# Altium footprint library Nanjar's Library.PcbLib: 153 footprints (part 2 of 10)
Each footprint in its own frame and in the unit in brackets; x right, y up, seen from the top. Pads: shape width x height; smd on the part's side, far side on the other; paste and mask are expansions set on the pad; w line width, h text height; cw(c..) or ccw(c..) is an arc to the next point about the centre after c.
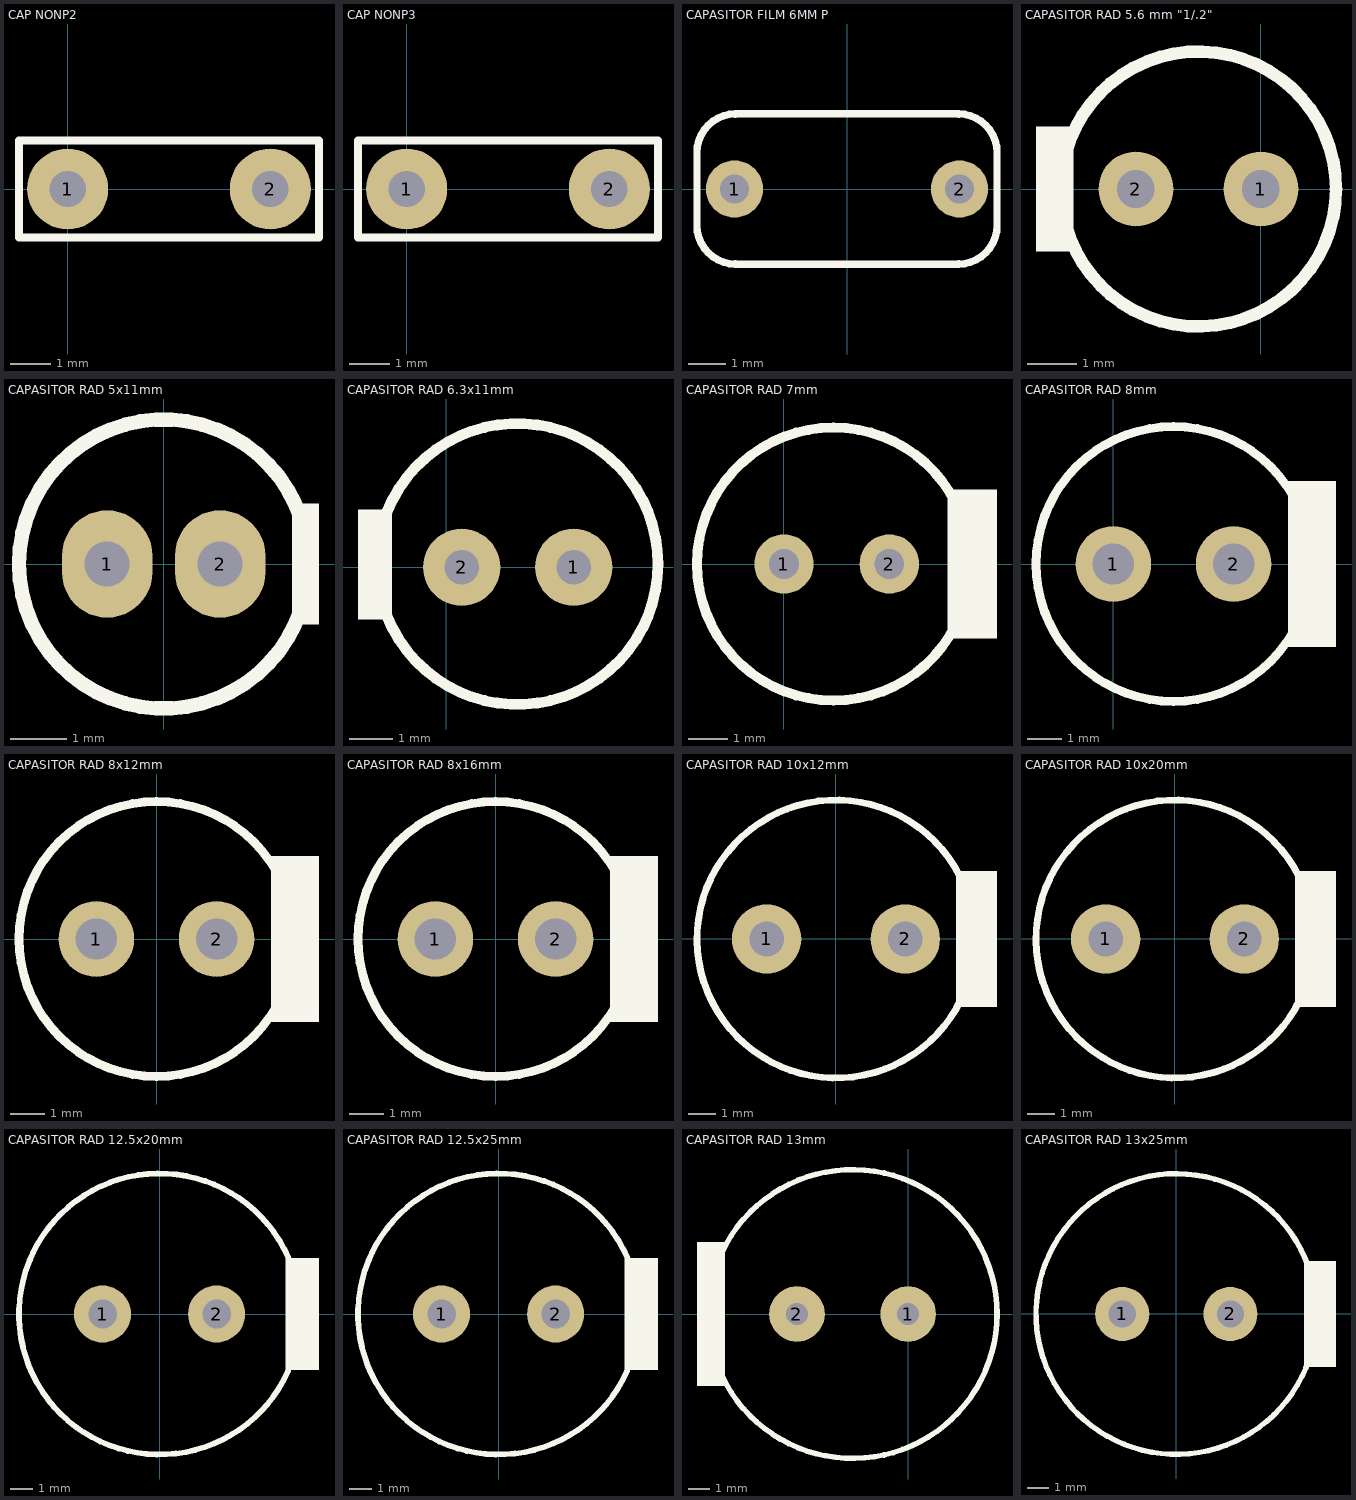
[diagram p1: the footprints below, top view; thin cyan lines are the x and y axes]

## CAP NONP2 [mm]
pads (2):
  round 2 hole 0.9: 1(0,0) 2(5,0)
Top Overlay:
  lines w0.2: -1.2,-1.2 6.2,-1.2 6.2,1.2 -1.2,1.2 -1.2,-1.2
3D body "User Library-Cap-5 (7_2x6_5x2_2)Dark.step": height 7.13, standoff -3.4, extent -1.1,-1.1 6.1,1.1

## CAP NONP3 [mm]
pads (2):
  round 2 hole 0.9: 1(0,0) 2(5,0)
Top Overlay:
  lines w0.2: -1.2,-1.2 6.2,-1.2 6.2,1.2 -1.2,1.2 -1.2,-1.2
3D body "User Library-Cap-5 (7_2x7_5x2_2).step": height 8.13, standoff -3.4, extent -1.1,-1.1 6.1,1.1

## CAPASITOR FILM 6MM P [mil]
pads (2):
  round 60 hole 30: 1(-118.11,0) 2(118.11,0)
Top Overlay:
  lines w7.87: -157.48,-38.41 ccw(c-117.16,-38.41) -117.16,-78.74 117.16,-78.74 ccw(c117.16,-38.42) 157.48,-38.42 157.48,38.41 ccw(c117.16,38.41) 117.16,78.74 -117.16,78.74 ccw(c-117.16,38.42) -157.48,38.42 -157.48,-38.41
3D body "User Library-Film Capacitor 6x8mm.step": height 472.48, standoff -196.56, extent -157.48,-78.74 157.48,78.74

## CAPASITOR RAD 5.6 mm "1/.2" [mil]
height 55.12
pads (2):
  round 60 hole 30: 1(0,0) 2(-100,0)
Top Overlay:
  circle w10: c-50,0 r110
  rectangle: -180,-50 -150,50
3D body "User Library-CE_R100_D200_H460.step": height 66.93, standoff -527.56, extent -148.74,-99.19 51.19,100.77

## CAPASITOR RAD 5x11mm [mm]
pads (2):
  oval 1.6x1.9 hole 0.8: 1(-1,0) 2(1,0)
Top Overlay:
  circle w0.254: c0,0 r2.56
  rectangle: 2.27,-1.068 2.75,1.075
3D body "User Library-Cap-EL(5x11-2)T.step": height 11.4, standoff -2.4, extent -2.485,-2.489 2.517,2.511

## CAPASITOR RAD 6.3x11mm [mm]
pads (2):
  round 1.8 hole 0.8: 1(2.967,0) 2(0.356,0)
Top Overlay:
  circle w0.25: c1.655,0.076 r3.273
  rectangle: -2.06,-1.219 -1.27,1.346
3D body "User Library-Cap-EL(6_3x11-2_5).step": height 11.5, standoff -2.7, extent -1.524,-3.175 4.778,3.112

## CAPASITOR RAD 7mm [mil]
pads (2):
  round 60 hole 30: 1(0,0) 2(106.3,0)
Top Overlay:
  circle w10: c50,0 r137.8
  rectangle: 165,-75 215,75

## CAPASITOR RAD 8mm [mm]
pads (2):
  round 2.2 hole 1.2: 1(0,0) 2(3.5,0)
Top Overlay:
  circle w0.254: c1.75,0 r4
  rectangle: 5.08,-2.413 6.477,2.413
3D body: height 11.51, standoff 5, extent -0.97,-2.72 4.47,2.72
3D body: height 11.5, standoff 0.1, extent -2.249,-3.999 5.749,3.999

## CAPASITOR RAD 8x12mm [mm]
pads (2):
  round 2.2 hole 1.2: 1(-1.75,0) 2(1.75,0)
Top Overlay:
  circle w0.254: c0,0 r4
  rectangle: 3.33,-2.413 4.727,2.413
3D body "User Library-Cap-EL(8x12-3_5)T.step": height 12.3, standoff -3.3, extent -4,-3.991 4.002,3.991

## CAPASITOR RAD 8x16mm [mm]
pads (2):
  round 2.2 hole 1.2: 1(-1.75,0) 2(1.75,0)
Top Overlay:
  circle w0.254: c0,0 r4
  rectangle: 3.33,-2.413 4.727,2.413
3D body "User Library-Cap-EL(8x16-3_5).step": height 16, standoff -3.3, extent -4,-3.996 4.002,3.997

## CAPASITOR RAD 10x12mm [mm]
pads (2):
  round 2.54 hole 1.27: 1(-2.54,0) 2(2.54,0)
Top Overlay:
  rectangle: 4.4,-2.5 5.9,2.5
  lines w0.254: -4.341,-2.659 ccw(c0,0) -4.341,-2.658
3D body "User Library-Cap-EL(10x12-5)T.step": height 12.5, standoff -3.5, extent -5,-4.993 5.002,4.993

## CAPASITOR RAD 10x20mm [mm]
pads (2):
  round 2.54 hole 1.27: 1(-2.54,0) 2(2.54,0)
Top Overlay:
  rectangle: 4.4,-2.5 5.9,2.5
  lines w0.254: -4.341,-2.659 ccw(c0,0) -4.341,-2.658
3D body "User Library-Cap-EL(10x20-5).step": height 20, standoff -3.3, extent -5,-4.996 5.002,4.99

## CAPASITOR RAD 12.5x20mm [mm]
pads (2):
  round 2.54 hole 1.27: 1(-2.54,0) 2(2.54,0)
Top Overlay:
  rectangle: 5.6,-2.5 7.1,2.5
  lines w0.254: 5.338,3.269 ccw(c0,0) 5.338,3.268
3D body "User Library-Cap-EL(12_5x20-5)T.step": height 20.5, standoff -3.5, extent -6.25,-6.23 6.252,6.231

## CAPASITOR RAD 12.5x25mm [mm]
pads (2):
  round 2.54 hole 1.27: 1(-2.54,0) 2(2.54,0)
Top Overlay:
  rectangle: 5.6,-2.5 7.1,2.5
  lines w0.254: 5.338,3.269 ccw(c0,0) 5.338,3.268
3D body "User Library-Cap-EL(12_5x25-5).step": height 25, standoff -3.3, extent -6.25,-6.236 6.252,6.236

## CAPASITOR RAD 13mm [mil]
pads (2):
  round 100 hole 40: 1(0,0) 2(-200,0)
Top Overlay:
  circle w10: c-100,0 r260
  rectangle: -379.97,-130.01 -329.97,129.99
3D body: height 118.11, standoff -78.74, extent -211.72,-11.79 -188.19,11.79
3D body: height 118.11, standoff -78.74, extent -11.71,-7.84 11.82,15.73
3D body: height 984.65, standoff 0, extent -286.6,-186.6 86.59,186.59
3D body: height 984.25, standoff 0.39, extent -359.98,-259.98 159.98,259.98
3D body: height 984.65, standoff 0, extent -360.16,-150.47 -252.9,145.2

## CAPASITOR RAD 13x25mm [mm]
pads (2):
  round 2.54 hole 1.27: 1(-2.54,0) 2(2.54,0)
Top Overlay:
  rectangle: 6,-2.5 7.5,2.5
  lines w0.254: 5.62,3.442 ccw(c0,0) 5.62,3.441
3D body "User Library-Cap-EL(13x25-5).step": height 25, standoff -3.3, extent -6.5,-6.487 6.502,6.488